# Altium footprint library SAMTEC SMD.PcbLib: 165 footprints (part 17 of 17)
Each footprint in its own frame and in the unit in brackets; x right, y up, seen from the top. Pads: shape width x height; smd on the part's side, far side on the other; paste and mask are expansions set on the pad; w line width, h text height; cw(c..) or ccw(c..) is an arc to the next point about the centre after c.
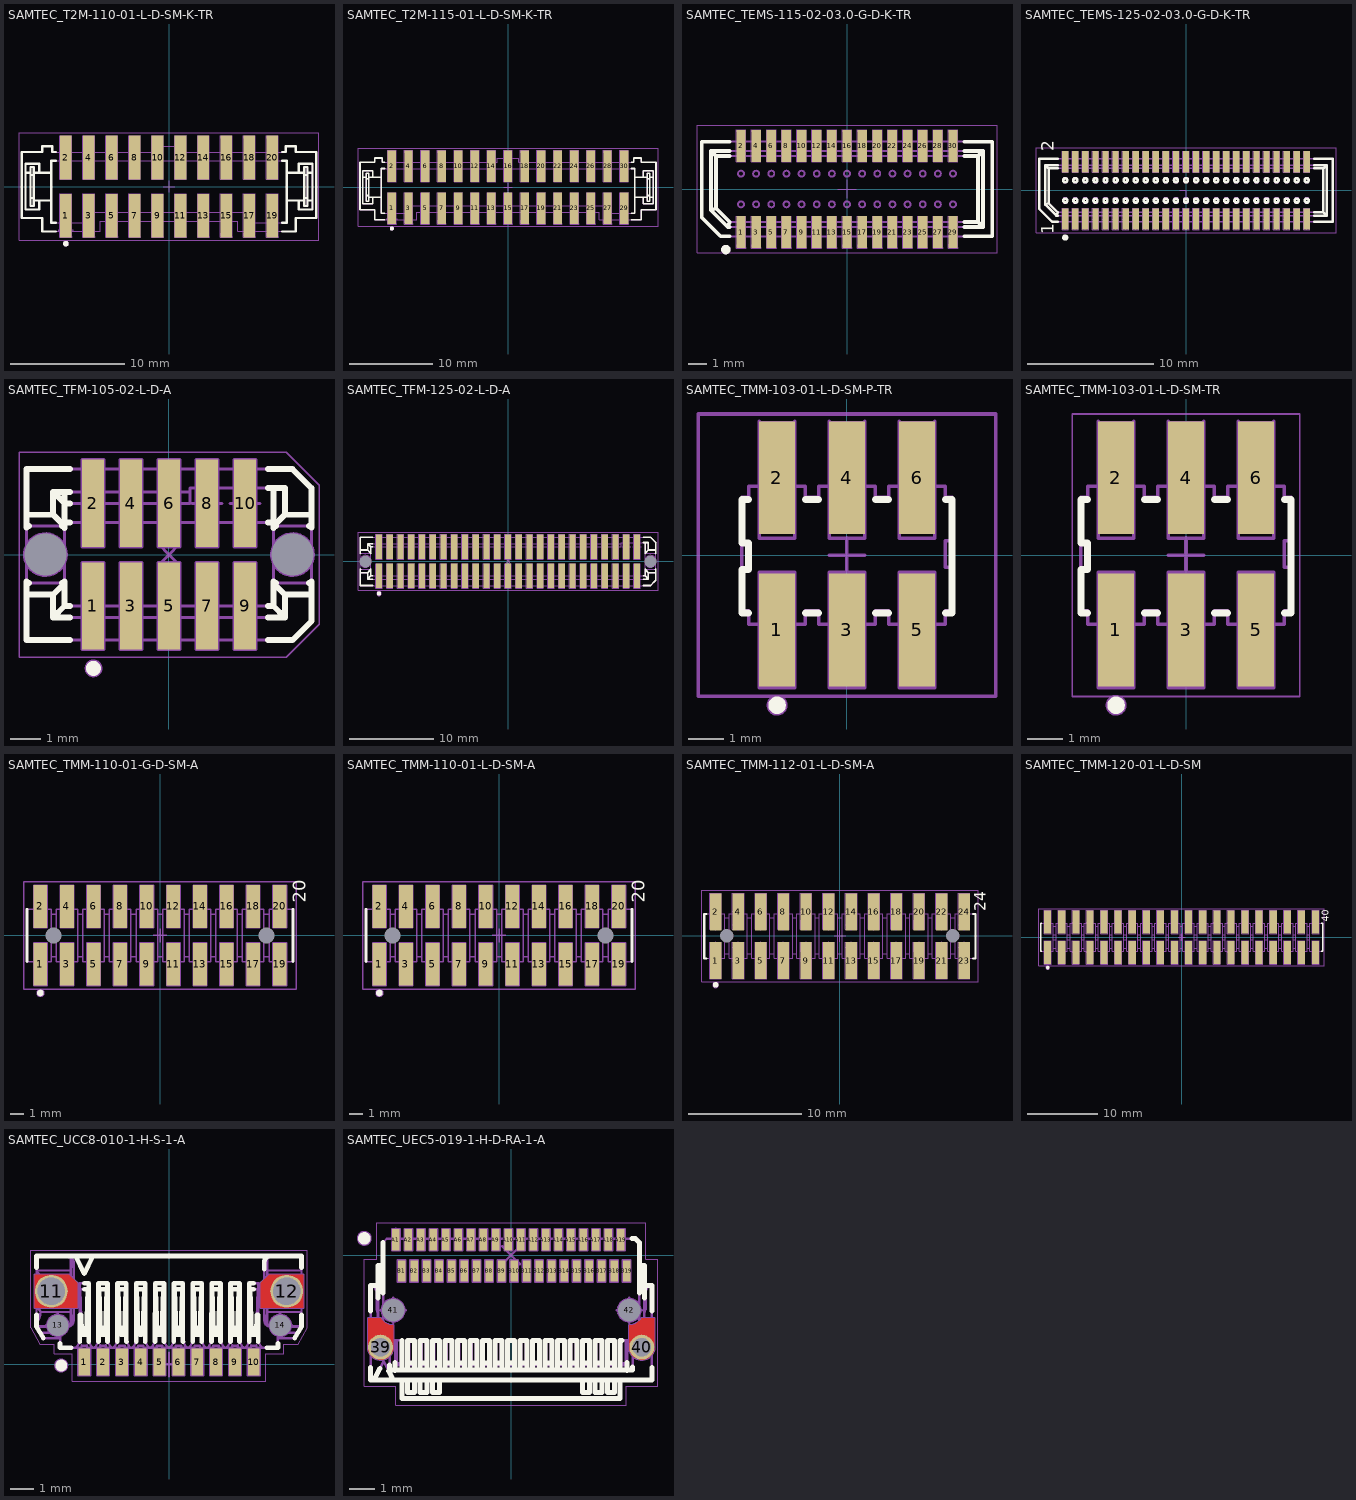
[diagram p16: the footprints below, top view; thin cyan lines are the x and y axes]

## SAMTEC_T2M-110-01-L-D-SM-K-TR [mm] "20 Contacts, Pitch 2mm, Dual Row Surface Mount Tiger Eye High-reliability Cable Header"
height 6.55
pads (20):
  rect 1.02x3.8 smd: 1(-9,-2.535) 2(-9,2.535) 3(-7,-2.535) 4(-7,2.535) 5(-5,-2.535) 6(-5,2.535) 7(-3,-2.535) 8(-3,2.535) 9(-1,-2.535) 10(-1,2.535) 11(1,-2.535) 12(1,2.535) 13(3,-2.535) 14(3,2.535) 15(5,-2.535) 16(5,2.535) 17(7,-2.535) 18(7,2.535) 19(9,-2.535) 20(9,2.535)
Top Overlay:
  circle w0.25: c-9,-4.985 r0.125
  lines w0.2: -12.512,1.207 -12.077,1.207 ; -12.077,-1.003 -11.793,-1.003 ; -12.077,1.003 -11.793,1.003 ; -11.793,-1.207 -10.275,-1.207 ; -11.793,1.207 -10.275,1.207 ; -11.312,-1.207 -11.312,-2 -12.512,-2 -12.512,2 -11.312,2 -11.312,1.207 ; -9.86,-3.915 -11.064,-3.915 -11.064,-2.735 -12.837,-2.735 -12.837,3.015 -11.066,3.015 -11.066,3.523 -10.177,3.523 -10.177,3.015 -9.86,3.015 ; -9.86,-3.155 -10.275,-3.155 -10.275,2.255 -9.86,2.255 ; 9.86,-3.915 11.064,-3.915 11.064,-2.735 12.837,-2.735 12.837,3.015 11.066,3.015 11.066,3.523 10.177,3.523 10.177,3.015 9.86,3.015 ; 9.86,-3.155 10.275,-3.155 10.275,2.255 9.86,2.255 ; 10.275,-1.207 11.793,-1.207 ; 10.275,1.207 11.793,1.207 ; 11.312,-1.207 11.312,-2 12.512,-2 12.512,2 11.312,2 11.312,1.207 ; 11.793,-1.003 12.077,-1.003 ; 11.793,1.003 12.077,1.003 ; 12.077,-1.207 12.512,-1.207 ; 12.077,1.207 12.512,1.207 ; -12.077,-1.702 -11.793,-1.702 -11.793,1.702 -12.077,1.702 -12.077,-1.702 ; 11.793,-1.702 11.793,1.702 12.077,1.702 12.077,-1.702 11.793,-1.702
Mechanical 8:
  lines w0.05: -0.5,0 0,0 ; 0,-0.5 0,0 ; 0,0.5 0,0 ; 0.5,0 0,0 ; -9.51,-4.435 -9,-2.535 -8.49,-4.435 ; -9.51,-4.435 -9.51,-0.635 -8.49,-0.635 -8.49,-4.435 ; -9.51,-4.435 -8.49,-4.435 ; -9.51,4.435 -9,2.535 -8.49,4.435 ; -9.51,4.435 -9.51,0.635 -8.49,0.635 -8.49,4.435 ; -9.51,4.435 -8.49,4.435 ; -7.51,-4.435 -7,-2.535 -6.49,-4.435 ; -7.51,-4.435 -7.51,-0.635 -6.49,-0.635 -6.49,-4.435 ; -7.51,-4.435 -6.49,-4.435 ; -7.51,4.435 -7,2.535 -6.49,4.435 ; -7.51,4.435 -7.51,0.635 -6.49,0.635 -6.49,4.435 ; -7.51,4.435 -6.49,4.435 ; -5.51,-4.435 -5,-2.535 -4.49,-4.435 ; -5.51,-4.435 -5.51,-0.635 -4.49,-0.635 -4.49,-4.435 ; -5.51,-4.435 -4.49,-4.435 ; -5.51,4.435 -5,2.535 -4.49,4.435 ; -5.51,4.435 -5.51,0.635 -4.49,0.635 -4.49,4.435 ; -5.51,4.435 -4.49,4.435 ; -3.51,-4.435 -3,-2.535 -2.49,-4.435 ; -3.51,-4.435 -3.51,-0.635 -2.49,-0.635 -2.49,-4.435 ; -3.51,-4.435 -2.49,-4.435 ; -3.51,4.435 -3,2.535 -2.49,4.435 ; -3.51,4.435 -3.51,0.635 -2.49,0.635 -2.49,4.435 ; -3.51,4.435 -2.49,4.435 ; -1.51,-4.435 -1,-2.535 -0.49,-4.435 ; -1.51,-4.435 -1.51,-0.635 -0.49,-0.635 -0.49,-4.435 ; -1.51,-4.435 -0.49,-4.435 ; -1.51,4.435 -1,2.535 -0.49,4.435 ; -1.51,4.435 -1.51,0.635 -0.49,0.635 -0.49,4.435 ; -1.51,4.435 -0.49,4.435 ; 0.49,-4.435 1,-2.535 1.51,-4.435 ; 0.49,-4.435 0.49,-0.635 1.51,-0.635 1.51,-4.435 ; 0.49,-4.435 1.51,-4.435 ; 0.49,4.435 1,2.535 1.51,4.435 ; 0.49,4.435 0.49,0.635 1.51,0.635 1.51,4.435 ; 0.49,4.435 1.51,4.435 ; 2.49,-4.435 3,-2.535 3.51,-4.435 ; 2.49,-4.435 2.49,-0.635 3.51,-0.635 3.51,-4.435 ; 2.49,-4.435 3.51,-4.435 ; 2.49,4.435 3,2.535 3.51,4.435 ; 2.49,4.435 2.49,0.635 3.51,0.635 3.51,4.435 ; 2.49,4.435 3.51,4.435 ; 4.49,-4.435 5,-2.535 5.51,-4.435 ; 4.49,-4.435 4.49,-0.635 5.51,-0.635 5.51,-4.435 ; 4.49,-4.435 5.51,-4.435 ; 4.49,4.435 5,2.535 5.51,4.435 ; 4.49,4.435 4.49,0.635 5.51,0.635 5.51,4.435 ; 4.49,4.435 5.51,4.435 ; 6.49,-4.435 7,-2.535 7.51,-4.435 ; 6.49,-4.435 6.49,-0.635 7.51,-0.635 7.51,-4.435 ; 6.49,-4.435 7.51,-4.435 ; 6.49,4.435 7,2.535 7.51,4.435 ; 6.49,4.435 6.49,0.635 7.51,0.635 7.51,4.435 ; 6.49,4.435 7.51,4.435 ; 8.49,-4.435 9,-2.535 9.51,-4.435 ; 8.49,-4.435 8.49,-0.635 9.51,-0.635 9.51,-4.435 ; 8.49,-4.435 9.51,-4.435 ; 8.49,4.435 9,2.535 9.51,4.435 ; 8.49,4.435 8.49,0.635 9.51,0.635 9.51,4.435 ; 8.49,4.435 9.51,4.435
Mechanical 14:
  drawing of 366 lines, arcs and shapes, not listed
Mechanical 15:
  lines w0.05: -13.087,-4.685 -13.087,4.685 13.087,4.685 13.087,-4.685 -13.087,-4.685
3D body "SAMTEC_T2M-110-01-L-D-SM-K-TR.stp": height 6.55, standoff 0, extent -12.837,-4.313 12.837,4.314

## SAMTEC_T2M-115-01-L-D-SM-K-TR [mm] "30 Contacts, Pitch 2mm, Dual Row Surface Mount Tiger Eye High-reliability Cable Header"
height 6.55
pads (30):
  rect 1.02x3.8 smd: 1(-14,-2.535) 2(-14,2.535) 3(-12,-2.535) 4(-12,2.535) 5(-10,-2.535) 6(-10,2.535) 7(-8,-2.535) 8(-8,2.535) 9(-6,-2.535) 10(-6,2.535) 11(-4,-2.535) 12(-4,2.535) 13(-2,-2.535) 14(-2,2.535) 15(0,-2.535) 16(0,2.535) 17(2,-2.535) 18(2,2.535) 19(4,-2.535) 20(4,2.535) 21(6,-2.535) 22(6,2.535) 23(8,-2.535) 24(8,2.535) 25(10,-2.535) 26(10,2.535) 27(12,-2.535) 28(12,2.535) 29(14,-2.535) 30(14,2.535)
Top Overlay:
  circle w0.25: c-14,-4.985 r0.125
  lines w0.2: -17.512,1.207 -17.077,1.207 ; -17.077,-1.003 -16.793,-1.003 ; -17.077,1.003 -16.793,1.003 ; -16.793,-1.207 -15.275,-1.207 ; -16.793,1.207 -15.275,1.207 ; -16.312,-1.207 -16.312,-2 -17.512,-2 -17.512,2 -16.312,2 -16.312,1.207 ; -14.86,-3.915 -16.064,-3.915 -16.064,-2.735 -17.837,-2.735 -17.837,3.015 -16.066,3.015 -16.066,3.523 -15.177,3.523 -15.177,3.015 -14.86,3.015 ; -14.86,-3.155 -15.275,-3.155 -15.275,2.255 -14.86,2.255 ; 14.86,-3.915 16.064,-3.915 16.064,-2.735 17.837,-2.735 17.837,3.015 16.066,3.015 16.066,3.523 15.177,3.523 15.177,3.015 14.86,3.015 ; 14.86,-3.155 15.275,-3.155 15.275,2.255 14.86,2.255 ; 15.275,-1.207 16.793,-1.207 ; 15.275,1.207 16.793,1.207 ; 16.312,-1.207 16.312,-2 17.512,-2 17.512,2 16.312,2 16.312,1.207 ; 16.793,-1.003 17.077,-1.003 ; 16.793,1.003 17.077,1.003 ; 17.077,-1.207 17.512,-1.207 ; 17.077,1.207 17.512,1.207 ; -17.077,-1.702 -17.077,1.702 -16.793,1.702 -16.793,-1.702 -17.077,-1.702 ; 16.793,-1.702 17.077,-1.702 17.077,1.702 16.793,1.702 16.793,-1.702
Mechanical 8:
  drawing of 184 lines, arcs and shapes, not listed
Mechanical 14:
  drawing of 516 lines, arcs and shapes, not listed
Mechanical 15:
  lines w0.05: -18.087,-4.685 18.087,-4.685 18.087,4.685 -18.087,4.685 -18.087,-4.685
3D body "SAMTEC_T2M-115-01-L-D-SM-K-TR.stp": height 6.55, standoff 0, extent -17.837,-4.313 17.837,4.314

## SAMTEC_TEMS-115-02-03.0-G-D-K-TR [mm] "30 Contacts, Pitch 0.8mm, Dual Row Straight Header, Micro Tiger Eye Slim Strip"
height 5.61
pads (30):
  rect 0.5x1.69 smd: 1(-5.6,-2.28) 2(-5.6,2.28) 3(-4.8,-2.28) 4(-4.8,2.28) 5(-4,-2.28) 6(-4,2.28) 7(-3.2,-2.28) 8(-3.2,2.28) 9(-2.4,-2.28) 10(-2.4,2.28) 11(-1.6,-2.28) 12(-1.6,2.28) 13(-0.8,-2.28) 14(-0.8,2.28) 15(0,-2.28) 16(0,2.28) 17(0.8,-2.28) 18(0.8,2.28) 19(1.6,-2.28) 20(1.6,2.28) 21(2.4,-2.28) 22(2.4,2.28) 23(3.2,-2.28) 24(3.2,2.28) 25(4,-2.28) 26(4,2.28) 27(4.8,-2.28) 28(4.8,2.28) 29(5.6,-2.28) 30(5.6,2.28)
Top Overlay:
  circle w0.25: c-6.4,-3.2 r0.125
  lines w0.2: -6.2,-2.5 -6.675,-2.5 -7.675,-1.5 -7.675,2.5 -6.2,2.5 ; -6.2,-2.004 -6.3,-2.004 ; -6.2,1.75 -6.925,1.75 ; -6.2,2.004 -7.179,2.004 ; 6.2,-2.5 7.675,-2.5 7.675,2.5 6.2,2.5 ; 6.2,-2.004 7.179,-2.004 ; 6.2,-1.75 6.925,-1.75 ; 6.2,1.75 6.925,1.75 ; 6.2,2.004 7.179,2.004 ; -7.179,-1.125 -6.925,-1.02 ; -7.179,-1.125 -7.179,2.004 ; -7.179,-1.125 -6.3,-2.004 ; -7.179,2.004 -6.925,1.75 ; -6.925,-1.02 -6.195,-1.75 -6.3,-2.004 ; -6.925,-1.02 -6.925,1.75 ; 6.925,-1.75 7.179,-2.004 ; 6.925,-1.75 6.925,1.75 ; 6.925,1.75 7.179,2.004 ; 7.179,-2.004 7.179,2.004
Mechanical 8:
  drawing of 184 lines, arcs and shapes, not listed
  text "29" at 5.2,-1.1 h0.5
  text "30" at 5.2,0.6 h0.5
  text "2" at -5.8,0.6 h0.5
  text "1" at -5.7,-1.1 h0.5
Mechanical 14:
  circle w0.25: c-6.4,-3.2 r0.125
  circle w0.1: c5.6,0.81 r0.158
  circle w0.1: c4.8,0.81 r0.158
  circle w0.1: c4,0.81 r0.158
  circle w0.1: c3.2,0.81 r0.158
  circle w0.1: c2.4,0.81 r0.158
  circle w0.1: c1.6,0.81 r0.158
  circle w0.1: c0.8,0.81 r0.158
  circle w0.1: c0,0.81 r0.158
  circle w0.1: c-0.8,0.81 r0.158
  circle w0.1: c-1.6,0.81 r0.158
  circle w0.1: c-2.4,0.81 r0.158
  circle w0.1: c-3.2,0.81 r0.158
  circle w0.1: c-4,0.81 r0.158
  circle w0.1: c-4.8,0.81 r0.158
  circle w0.1: c-5.6,0.81 r0.158
  circle w0.1: c5.6,-0.81 r0.158
  circle w0.1: c4.8,-0.81 r0.158
  circle w0.1: c4,-0.81 r0.158
  circle w0.1: c3.2,-0.81 r0.158
  circle w0.1: c2.4,-0.81 r0.158
  circle w0.1: c1.6,-0.81 r0.158
  circle w0.1: c0.8,-0.81 r0.158
  circle w0.1: c0,-0.81 r0.158
  circle w0.1: c-0.8,-0.81 r0.158
  circle w0.1: c-1.6,-0.81 r0.158
  circle w0.1: c-2.4,-0.81 r0.158
  circle w0.1: c-3.2,-0.81 r0.158
  circle w0.1: c-4,-0.81 r0.158
  circle w0.1: c-4.8,-0.81 r0.158
  circle w0.1: c-5.6,-0.81 r0.158
  lines w0.1: -7.179,-1.125 -6.925,-1.02 ; -7.179,-1.125 -7.179,2.004 ; -7.179,-1.125 -6.3,-2.004 ; -7.179,2.004 -6.925,1.75 ; -7.179,2.004 7.179,2.004 ; -6.925,-1.02 -6.195,-1.75 ; -6.925,-1.02 -6.925,1.75 ; -6.925,1.75 6.925,1.75 ; -6.3,-2.004 -6.195,-1.75 ; -6.3,-2.004 7.179,-2.004 ; -6.195,-1.75 6.925,-1.75 ; 6.925,-1.75 7.179,-2.004 ; 6.925,-1.75 6.925,1.75 ; 6.925,1.75 7.179,2.004 ; 7.179,-2.004 7.179,2.004 ; -7.675,-1.5 -7.675,2.5 7.675,2.5 7.675,-2.5 -6.675,-2.5 -7.675,-1.5
Mechanical 15:
  lines w0.05: -7.925,-3.375 -7.925,3.375 7.925,3.375 7.925,-3.375 -7.925,-3.375
3D body "SAMTEC_TEMS-115-02-03.0-G-D-K-TR.stp": height 5.58, standoff 0, extent -7.675,-2.76 7.675,2.761

## SAMTEC_TEMS-125-02-03.0-G-D-K-TR [mm] "50 Contacts, Pitch 0.8mm, Dual Row Surface Mount Micro Tiger Eye Header"
height 5.61
pads (50):
  rect 0.5x1.69 smd: 1(-9.6,-2.28) 2(-9.6,2.28) 3(-8.8,-2.28) 4(-8.8,2.28) 5(-8,-2.28) 6(-8,2.28) 7(-7.2,-2.28) 8(-7.2,2.28) 9(-6.4,-2.28) 10(-6.4,2.28) 11(-5.6,-2.28) 12(-5.6,2.28) 13(-4.8,-2.28) 14(-4.8,2.28) 15(-4,-2.28) 16(-4,2.28) 17(-3.2,-2.28) 18(-3.2,2.28) 19(-2.4,-2.28) 20(-2.4,2.28) 21(-1.6,-2.28) 22(-1.6,2.28) 23(-0.8,-2.28) 24(-0.8,2.28) 25(0,-2.28) 26(0,2.28) 27(0.8,-2.28) 28(0.8,2.28) 29(1.6,-2.28) 30(1.6,2.28) 31(2.4,-2.28) 32(2.4,2.28) 33(3.2,-2.28) 34(3.2,2.28) 35(4,-2.28) 36(4,2.28) 37(4.8,-2.28) 38(4.8,2.28) 39(5.6,-2.28) 40(5.6,2.28) 41(6.4,-2.28) 42(6.4,2.28) 43(7.2,-2.28) 44(7.2,2.28) 45(8,-2.28) 46(8,2.28) 47(8.8,-2.28) 48(8.8,2.28) 49(9.6,-2.28) 50(9.6,2.28)
Top Overlay:
  circle w0.25: c-9.6,-3.75 r0.125
  circle w0.2: c9.6,-0.81 r0.158
  circle w0.2: c8.8,-0.81 r0.158
  circle w0.2: c8,-0.81 r0.158
  circle w0.2: c7.2,-0.81 r0.158
  circle w0.2: c6.4,-0.81 r0.158
  circle w0.2: c5.6,-0.81 r0.158
  circle w0.2: c4.8,-0.81 r0.158
  circle w0.2: c4,-0.81 r0.158
  circle w0.2: c3.2,-0.81 r0.158
  circle w0.2: c2.4,-0.81 r0.158
  circle w0.2: c1.6,-0.81 r0.158
  circle w0.2: c0.8,-0.81 r0.158
  circle w0.2: c0,-0.81 r0.158
  circle w0.2: c-0.8,-0.81 r0.158
  circle w0.2: c-1.6,-0.81 r0.158
  circle w0.2: c-2.4,-0.81 r0.158
  circle w0.2: c-3.2,-0.81 r0.158
  circle w0.2: c-4,-0.81 r0.158
  circle w0.2: c-4.8,-0.81 r0.158
  circle w0.2: c-5.6,-0.81 r0.158
  circle w0.2: c-6.4,-0.81 r0.158
  circle w0.2: c-7.2,-0.81 r0.158
  circle w0.2: c-8,-0.81 r0.158
  circle w0.2: c-8.8,-0.81 r0.158
  circle w0.2: c-9.6,-0.81 r0.158
  circle w0.2: c9.6,0.81 r0.158
  circle w0.2: c8.8,0.81 r0.158
  circle w0.2: c8,0.81 r0.158
  circle w0.2: c7.2,0.81 r0.158
  circle w0.2: c6.4,0.81 r0.158
  circle w0.2: c5.6,0.81 r0.158
  circle w0.2: c4.8,0.81 r0.158
  circle w0.2: c4,0.81 r0.158
  circle w0.2: c3.2,0.81 r0.158
  circle w0.2: c2.4,0.81 r0.158
  circle w0.2: c1.6,0.81 r0.158
  circle w0.2: c0.8,0.81 r0.158
  circle w0.2: c0,0.81 r0.158
  circle w0.2: c-0.8,0.81 r0.158
  circle w0.2: c-1.6,0.81 r0.158
  circle w0.2: c-2.4,0.81 r0.158
  circle w0.2: c-3.2,0.81 r0.158
  circle w0.2: c-4,0.81 r0.158
  circle w0.2: c-4.8,0.81 r0.158
  circle w0.2: c-5.6,0.81 r0.158
  circle w0.2: c-6.4,0.81 r0.158
  circle w0.2: c-7.2,0.81 r0.158
  circle w0.2: c-8,0.81 r0.158
  circle w0.2: c-8.8,0.81 r0.158
  circle w0.2: c-9.6,0.81 r0.158
  lines w0.2: -10.2,-2.5 -10.634,-2.5 -11.675,-1.459 -11.675,2.5 -10.2,2.5 ; -10.2,-2.004 -10.3,-2.004 ; -10.2,1.75 -10.925,1.75 ; -10.2,2.004 -11.179,2.004 ; 10.2,-2.5 11.675,-2.5 11.675,2.5 10.2,2.5 ; 10.2,-2.004 11.179,-2.004 ; 10.2,-1.75 10.925,-1.75 ; 10.2,1.75 10.925,1.75 ; 10.2,2.004 11.179,2.004 ; -11.179,-1.125 -10.925,-1.02 ; -11.179,-1.125 -11.179,2.004 ; -11.179,-1.125 -10.3,-2.004 ; -11.179,2.004 -10.925,1.75 ; -10.925,-1.02 -10.925,1.75 ; -10.925,-1.02 -10.195,-1.75 -10.3,-2.004 ; 10.925,-1.75 11.179,-2.004 ; 10.925,-1.75 10.925,1.75 ; 10.925,1.75 11.179,2.004 ; 11.179,-2.004 11.179,2.004
  text "1" at -10.5,-3.5 h1
  text "2" at -10.5,3.1 h1
Mechanical 8:
  drawing of 302 lines, arcs and shapes, not listed
Mechanical 14:
  drawing of 370 lines, arcs and shapes, not listed
Mechanical 15:
  lines w0.05: -11.925,-3.375 -11.925,3.375 11.925,3.375 11.925,-3.375 -11.925,-3.375
3D body "SAMTEC_TEMS-125-02-03.stp": height 5.58, standoff 0, extent -11.674,-2.76 11.675,2.761

## SAMTEC_TFM-105-02-L-D-A [mm] "10 Contacts - Pitch 1.27mm - Dual Row Straight SMT Header"
height 5.72
pads (12):
  rect 0.74x2.92 smd: 1(-2.54,-1.715) 2(-2.54,1.715) 3(-1.27,-1.715) 4(-1.27,1.715) 5(0,-1.715) 6(0,1.715) 7(1.27,-1.715) 8(1.27,1.715) 9(2.54,-1.715) 10(2.54,1.715)
  round 0.5 hole 1.4 unplated mask+0.45: MEC1(-4.13,0) MEC2(4.13,0)
Top Overlay:
  circle w0.25: c-2.525,-3.8 r0.125
  circle w0.25: c-2.525,-3.8 r0.125
  lines w0.2: -4.762,-1.333 -3.873,-1.333 ; -4.762,-0.953 -4.68,-0.953 ; -4.762,-0.9 -4.762,-2.858 -3.31,-2.858 ; -4.762,0.9 -4.762,2.858 -3.31,2.858 ; -4.762,0.953 -4.68,0.953 ; -4.762,1.333 -3.873,1.333 ; -3.58,-0.953 -3.492,-0.953 -3.873,-1.333 ; -3.58,0.953 -3.492,0.953 -3.873,1.333 ; -3.492,-0.896 -3.492,-1.714 ; -3.492,0.896 -3.492,2.095 ; -3.492,1.079 -3.31,1.079 ; -3.31,-2.095 -3.873,-2.095 ; -3.31,-1.714 -3.492,-1.714 ; -3.31,1.714 -3.492,1.714 -3.873,2.095 ; -3.31,2.095 -3.873,2.095 ; 3.31,-2.858 4.128,-2.858 4.763,-2.222 4.763,-0.9 ; 3.31,-2.095 3.874,-2.095 ; 3.31,-1.714 3.493,-1.714 ; 3.31,1.079 3.493,1.079 ; 3.31,2.222 3.874,2.222 3.874,1.333 ; 3.31,2.858 4.128,2.858 4.763,2.222 4.763,0.9 ; 3.493,-0.896 3.493,-1.714 ; 3.493,0.896 3.493,2.222 ; 3.58,-0.953 3.493,-0.953 3.874,-1.333 ; 3.58,0.953 3.493,0.953 3.874,1.333 ; 4.68,-0.953 4.763,-0.953 ; 4.68,0.953 4.763,0.953 ; 4.763,-1.333 3.874,-1.333 ; 4.763,1.333 3.874,1.333 ; -3.873,-2.095 -3.492,-1.714 ; -3.873,-2.095 -3.873,-1.333 ; -3.873,1.333 -3.873,2.095 ; 3.493,-1.714 3.874,-2.095 ; 3.874,-2.095 3.874,-1.333
Mechanical 8:
  circle w0.1: c4.13,0 r0.7
  circle w0.1: c-4.13,0 r0.7
  lines w0.1: -4.63,0 -4.13,0 ; -4.13,-0.5 -4.13,0 ; -4.13,0.5 -4.13,0 ; -3.63,0 -4.13,0 ; -3.04,-1.715 -2.54,-1.715 ; -3.04,1.715 -2.54,1.715 ; -2.54,-2.215 -2.54,-1.715 ; -2.54,-1.215 -2.54,-1.715 ; -2.54,1.215 -2.54,1.715 ; -2.54,2.215 -2.54,1.715 ; -2.04,-1.715 -2.54,-1.715 ; -2.04,1.715 -2.54,1.715 ; -1.77,-1.715 -1.27,-1.715 ; -1.77,1.715 -1.27,1.715 ; -1.27,-2.215 -1.27,-1.715 ; -1.27,-1.215 -1.27,-1.715 ; -1.27,1.215 -1.27,1.715 ; -1.27,2.215 -1.27,1.715 ; -0.77,-1.715 -1.27,-1.715 ; -0.77,1.715 -1.27,1.715 ; -0.5,-1.715 0,-1.715 ; -0.5,1.715 0,1.715 ; -0.354,-0.354 0,0 ; -0.354,0.354 0,0 ; 0,-2.215 0,-1.715 ; 0,-1.215 0,-1.715 ; 0,1.215 0,1.715 ; 0,2.215 0,1.715 ; 0.354,-0.354 0,0 ; 0.354,0.354 0,0 ; 0.5,-1.715 0,-1.715 ; 0.5,1.715 0,1.715 ; 0.77,-1.715 1.27,-1.715 ; 0.77,1.715 1.27,1.715 ; 1.27,-2.215 1.27,-1.715 ; 1.27,-1.215 1.27,-1.715 ; 1.27,1.215 1.27,1.715 ; 1.27,2.215 1.27,1.715 ; 1.77,-1.715 1.27,-1.715 ; 1.77,1.715 1.27,1.715 ; 2.04,-1.715 2.54,-1.715 ; 2.04,1.715 2.54,1.715 ; 2.54,-2.215 2.54,-1.715 ; 2.54,-1.215 2.54,-1.715 ; 2.54,1.215 2.54,1.715 ; 2.54,2.215 2.54,1.715 ; 3.04,-1.715 2.54,-1.715 ; 3.04,1.715 2.54,1.715 ; 3.63,0 4.13,0 ; 4.13,-0.5 4.13,0 ; 4.13,0.5 4.13,0 ; 4.63,0 4.13,0 ; -2.91,-3.175 -2.91,-0.255 -2.17,-0.255 -2.17,-3.175 -2.91,-3.175 ; -2.91,0.255 -2.91,3.175 -2.17,3.175 -2.17,0.255 -2.91,0.255 ; -1.64,-3.175 -1.64,-0.255 -0.9,-0.255 -0.9,-3.175 -1.64,-3.175 ; -1.64,0.255 -1.64,3.175 -0.9,3.175 -0.9,0.255 -1.64,0.255 ; -0.37,-3.175 -0.37,-0.255 0.37,-0.255 0.37,-3.175 -0.37,-3.175 ; -0.37,0.255 -0.37,3.175 0.37,3.175 0.37,0.255 -0.37,0.255 ; 0.9,-3.175 0.9,-0.255 1.64,-0.255 1.64,-3.175 0.9,-3.175 ; 0.9,0.255 0.9,3.175 1.64,3.175 1.64,0.255 0.9,0.255 ; 2.17,-3.175 2.17,-0.255 2.91,-0.255 2.91,-3.175 2.17,-3.175 ; 2.17,0.255 2.17,3.175 2.91,3.175 2.91,0.255 2.17,0.255
Mechanical 14:
  circle w0.1: c-2.523,-3.8 r0.25
  lines w0.1: -4.762,-1.333 -3.873,-1.333 ; -4.762,-0.953 -3.492,-0.953 -3.873,-1.333 ; -4.762,0.953 -3.492,0.953 -3.873,1.333 ; -4.762,1.333 -3.873,1.333 ; -3.492,1.079 3.493,1.079 ; -3.492,2.095 -3.492,-1.714 ; 0.699,2.095 -3.873,2.095 ; 3.493,2.222 3.493,-1.714 ; 4.763,-1.333 3.874,-1.333 ; 4.763,-0.953 3.493,-0.953 3.874,-1.333 ; 4.763,0.953 3.493,0.953 3.874,1.333 ; 4.763,1.333 3.874,1.333 ; -3.873,-2.095 -3.492,-1.714 ; -3.873,-2.095 -3.873,-1.333 ; -3.873,-2.095 3.874,-2.095 ; -3.873,1.333 -3.873,2.095 ; -3.873,2.095 -3.492,1.714 0.699,1.714 0.699,2.222 3.874,2.222 3.874,1.333 ; -3.492,-1.714 3.493,-1.714 ; 3.493,-1.714 3.874,-2.095 ; 3.874,-2.095 3.874,-1.333 ; -4.762,-2.858 4.128,-2.858 4.763,-2.222 4.763,2.222 4.128,2.858 -4.762,2.858 -4.762,-2.858
Mechanical 15:
  lines w0.05: -5.012,-3.425 3.914,-3.425 5.013,-2.326 5.013,2.326 3.914,3.425 -5.012,3.425 -5.012,-3.425
3D body "SAMTEC_TFM–105–02–L–D–A.stp": height 5.59, standoff -1.14, extent -4.765,-2.984 4.765,2.985

## SAMTEC_TFM-125-02-L-D-A [mm] "50 Contacts - Pitch 1.27mm - Dual Row Straight SMT Header"
height 5.72
pads (52):
  rect 0.74x2.92 smd: 1(-15.24,-1.715) 2(-15.24,1.715) 3(-13.97,-1.715) 4(-13.97,1.715) 5(-12.7,-1.715) 6(-12.7,1.715) 7(-11.43,-1.715) 8(-11.43,1.715) 9(-10.16,-1.715) 10(-10.16,1.715) 11(-8.89,-1.715) 12(-8.89,1.715) 13(-7.62,-1.715) 14(-7.62,1.715) 15(-6.35,-1.715) 16(-6.35,1.715) 17(-5.08,-1.715) 18(-5.08,1.715) 19(-3.81,-1.715) 20(-3.81,1.715) 21(-2.54,-1.715) 22(-2.54,1.715) 23(-1.27,-1.715) 24(-1.27,1.715) 25(0,-1.715) 26(0,1.715) 27(1.27,-1.715) 28(1.27,1.715) 29(2.54,-1.715) 30(2.54,1.715) 31(3.81,-1.715) 32(3.81,1.715) 33(5.08,-1.715) 34(5.08,1.715) 35(6.35,-1.715) 36(6.35,1.715) 37(7.62,-1.715) 38(7.62,1.715) 39(8.89,-1.715) 40(8.89,1.715) 41(10.16,-1.715) 42(10.16,1.715) 43(11.43,-1.715) 44(11.43,1.715) 45(12.7,-1.715) 46(12.7,1.715) 47(13.97,-1.715) 48(13.97,1.715) 49(15.24,-1.715) 50(15.24,1.715)
  round 0.5 hole 1.4 unplated mask+0.45: MEC1(-16.83,0) MEC2(16.83,0)
Top Overlay:
  circle w0.25: c-15.225,-3.8 r0.125
  circle w0.25: c-15.225,-3.8 r0.125
  lines w0.2: -17.463,-1.333 -16.574,-1.333 ; -17.463,-0.953 -17.38,-0.953 ; -17.463,-0.9 -17.463,-2.858 -16.01,-2.858 ; -17.463,0.9 -17.463,2.858 -16.01,2.858 ; -17.463,0.953 -17.38,0.953 ; -17.463,1.333 -16.574,1.333 ; -16.28,-0.953 -16.193,-0.953 -16.574,-1.333 ; -16.28,0.953 -16.193,0.953 -16.574,1.333 ; -16.193,-0.896 -16.193,-1.714 ; -16.193,0.896 -16.193,1.714 ; -16.01,-2.095 -16.574,-2.095 ; -16.01,-1.714 -16.193,-1.714 ; -16.01,1.714 -16.193,1.714 ; -16.01,2.095 -16.574,2.095 ; 16.01,-2.858 16.828,-2.858 17.463,-2.222 17.463,-0.9 ; 16.01,-2.095 16.574,-2.095 ; 16.01,-1.714 16.193,-1.714 ; 16.01,2.222 16.574,2.222 16.574,1.333 ; 16.01,2.858 16.828,2.858 17.463,2.222 17.463,0.9 ; 16.193,-0.896 16.193,-1.714 ; 16.193,0.896 16.193,2.222 ; 16.28,-0.953 16.193,-0.953 16.574,-1.333 ; 16.28,0.953 16.193,0.953 16.574,1.333 ; 17.38,-0.953 17.463,-0.953 ; 17.38,0.953 17.463,0.953 ; 17.463,-1.333 16.574,-1.333 ; 17.463,1.333 16.574,1.333 ; -16.574,-2.095 -16.574,-1.333 ; -16.574,-2.095 -16.193,-1.714 ; -16.574,1.333 -16.574,2.095 ; -16.574,2.095 -16.193,1.714 ; 16.193,-1.714 16.574,-2.095 ; 16.574,-2.095 16.574,-1.333
Mechanical 8:
  drawing of 426 lines, arcs and shapes, not listed
Mechanical 14:
  circle w0.1: c-15.223,-3.8 r0.25
  lines w0.1: -17.463,-1.333 -16.574,-1.333 ; -17.463,-0.953 -16.193,-0.953 -16.574,-1.333 ; -17.463,0.953 -16.193,0.953 -16.574,1.333 ; -17.463,1.333 -16.574,1.333 ; 13.399,2.095 -16.574,2.095 ; 16.193,2.222 16.193,-1.714 ; 17.463,-1.333 16.574,-1.333 ; 17.463,-0.953 16.193,-0.953 16.574,-1.333 ; 17.463,0.953 16.193,0.953 16.574,1.333 ; 17.463,1.333 16.574,1.333 ; -16.574,-2.095 -16.574,-1.333 ; -16.574,-2.095 -16.193,-1.714 ; -16.574,-2.095 16.574,-2.095 ; -16.574,1.333 -16.574,2.095 ; -16.574,2.095 -16.193,1.714 ; -16.193,-1.714 16.193,-1.714 ; -16.193,-1.714 -16.193,1.714 ; -16.193,1.714 13.399,1.714 13.399,2.222 16.574,2.222 16.574,1.333 ; 16.193,-1.714 16.574,-2.095 ; 16.574,-2.095 16.574,-1.333 ; -17.463,-2.858 -17.463,2.858 16.828,2.858 17.463,2.222 17.463,-2.222 16.828,-2.858 -17.463,-2.858